# Altium footprint library CONECTER.PcbLib: 120 footprints (part 6 of 8)
Each footprint in its own frame and in the unit in brackets; x right, y up, seen from the top. Pads: shape width x height; smd on the part's side, far side on the other; paste and mask are expansions set on the pad; w line width, h text height; cw(c..) or ccw(c..) is an arc to the next point about the centre after c.
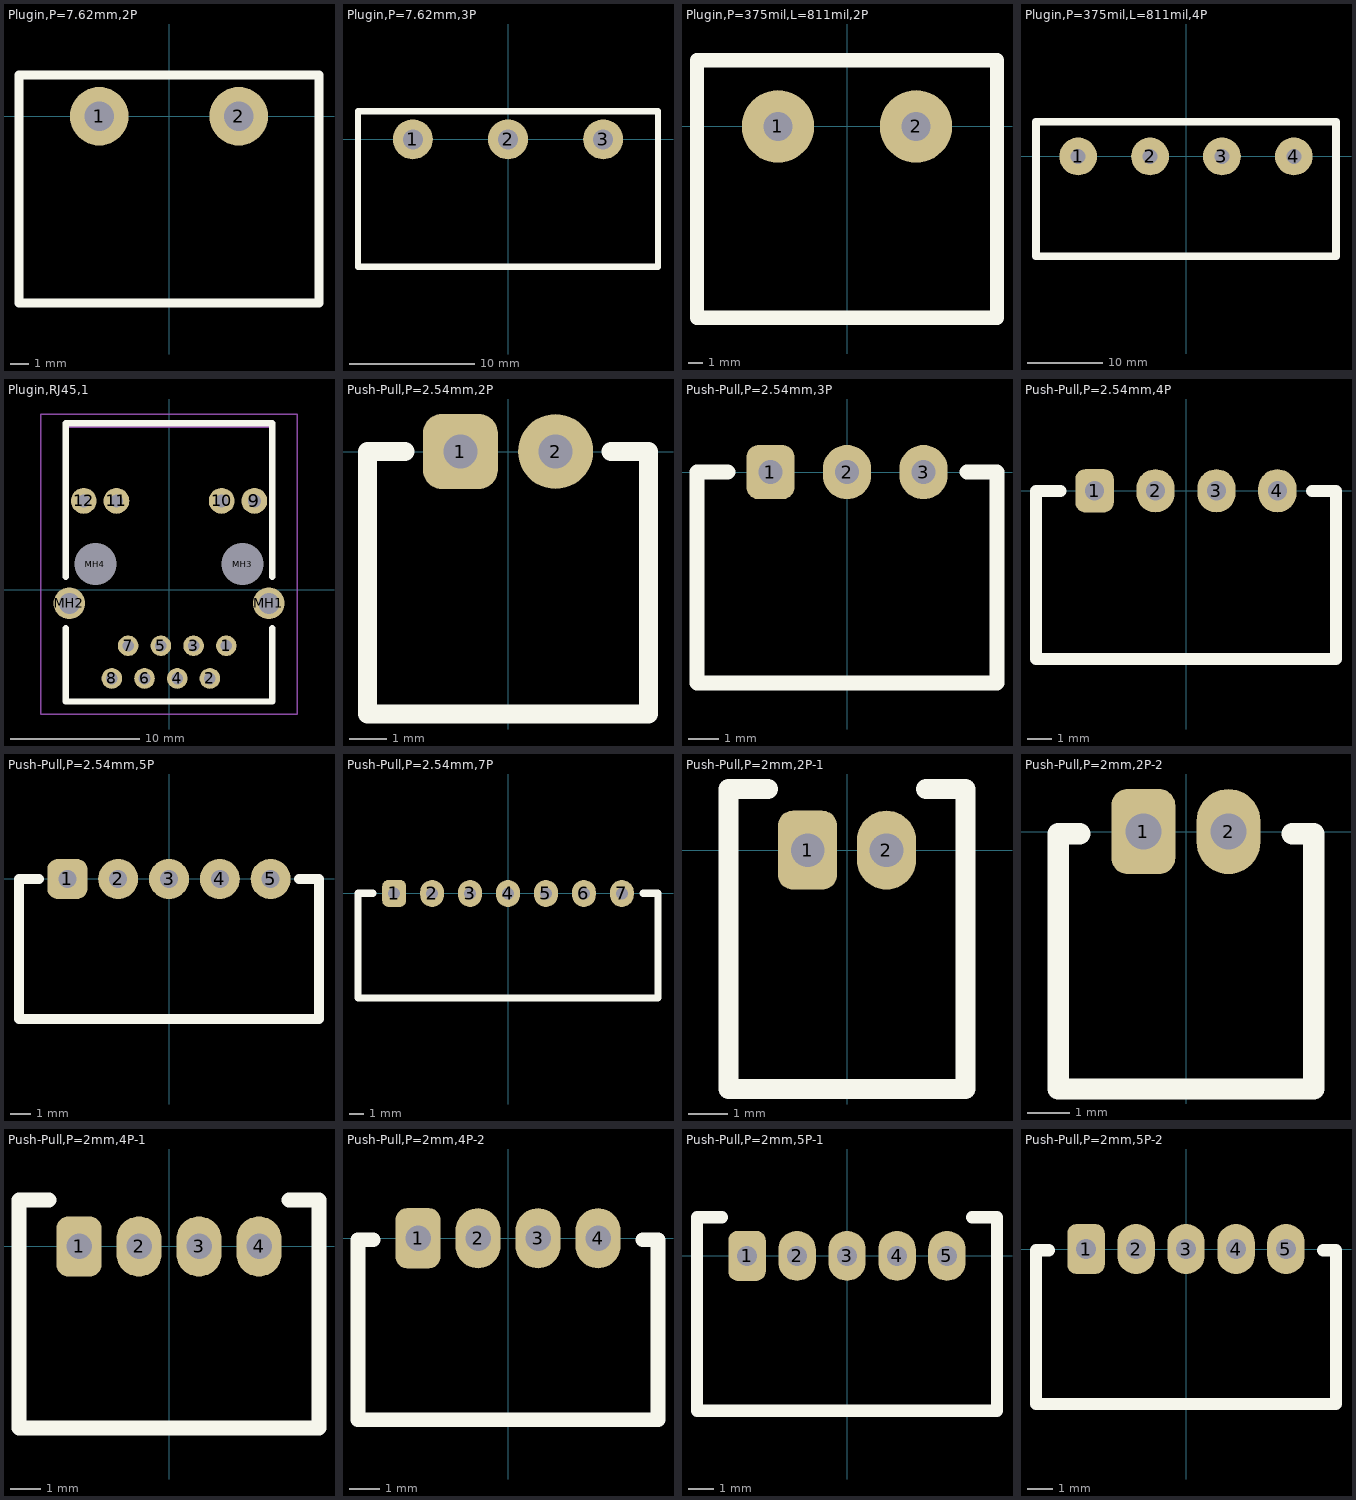
[diagram p5: the footprints below, top view; thin cyan lines are the x and y axes]

## Plugin,P=7.62mm,2P [mm]
pads (2):
  round 3.2 hole 1.6: 1(-3.81,0) 2(3.81,0)
Top Overlay:
  lines w0.5: -8.195,-10.2 8.195,-10.2 8.195,2.25 -8.195,2.25 -8.195,-10.2

## Plugin,P=7.62mm,3P [mm]
pads (3):
  round 3.2 hole 1.6: 1(-7.62,0) 2(0,0) 3(7.62,0)
Top Overlay:
  lines w0.5: -12.005,-10.2 12.005,-10.2 12.005,2.25 -12.005,2.25 -12.005,-10.2

## Plugin,P=375mil,L=811mil,2P [mm]
pads (2):
  round 5 hole 2 mask+2: 1(-4.763,0) 2(4.763,0)
Top Overlay:
  lines w1: -10.351,-13.208 10.351,-13.208 10.351,4.572 -10.351,4.572 -10.351,-13.208
3D body "c-4-1437652-6-b-3d.stp": height 15.86, standoff -5.09, extent -10.3,-13.208 10.3,4.572

## Plugin,P=375mil,L=811mil,4P [mm]
pads (4):
  round 5 hole 2 mask+2: 1(-14.287,0) 2(-4.763,0) 3(4.763,0) 4(14.287,0)
Top Overlay:
  lines w1: -19.875,-13.208 -19.875,4.572 19.875,4.572 19.875,-13.208 -19.875,-13.208
3D body "c-6-1437652-7-p-3d.stp": height 15.88, standoff -5.08, extent -19.825,-13.208 19.825,4.572

## Plugin,RJ45,1 [mm]
pads (16):
  round 1.6 hole 0.9: 1(4.445,-4.355) 2(3.175,-6.895) 3(1.905,-4.355) 4(0.635,-6.895) 5(-0.635,-4.355) 6(-1.905,-6.895) 7(-3.175,-4.355) 8(-4.445,-6.895)
  round 2 hole 1: 9(6.625,6.895) 10(4.085,6.895) 11(-4.085,6.895) 12(-6.625,6.895)
  round 2.445 hole 1.63: MH1(7.745,-1.055) MH2(-7.745,-1.055)
  round 1.625 hole 3.25 unplated: MH3(5.715,1.995) MH4(-5.715,1.995)
Top Overlay:
  lines w0.1: -8.02,-8.655 -8.02,-3.255 ; 8.02,-8.655 8.02,-3.255 ; 8.02,1.245 8.02,12.915
  lines w0.5: -8.02,-3 -8.02,-8.685 8.02,-8.685 8.02,-3 ; -8.02,0.995 -8.02,12.915 ; -8.02,1 -8.02,12.915 ; 8.02,1 8.02,12.915 -8.02,12.915
Mechanical 15:
  lines w0.2: -8.02,-8.655 8.02,-8.655 ; -8.02,12.645 8.02,12.645
Mechanical 20:
  lines w0.1: -9.972,-9.655 9.963,-9.655 9.963,13.645 -9.972,13.645 -9.972,-9.655
3D body "HR911105A.stp": height 13.97, standoff -2.53, extent -8.006,-8.578 7.874,12.822

## Push-Pull,P=2.54mm,2P [mm]
pads (2):
  rrect50% 2x2 hole 0.9 mask+0.1: 1(-1.27,0)
  round 2 hole 0.9 mask+0.1: 2(1.27,0)
Top Overlay:
  lines w0.5: -2.75,0 -3.75,0 -3.75,-7 3.75,-7 3.75,0 2.75,0
3D body "JST - XH - Thru (R) - 2Pin - 2.54mm.stp": height 5.84, standoff -3.38, extent -3.607,-7.534 3.607,0.503

## Push-Pull,P=2.54mm,3P [mm]
pads (3):
  rrect50% 1.6x1.8 hole 0.8 mask+0.1: 1(-2.54,0)
  oval 1.6x1.8 hole 0.8 mask+0.1: 2(0,0) 3(2.54,0)
Top Overlay:
  lines w0.5: -4.98,0 -4.98,-7 4.98,-7 4.98,0 3.98,0 ; -4.96,0 -3.96,0
3D body "JST - XH - Thru R - 3Pin - 2.54mm.stp": height 5.84, standoff -3.38, extent -4.877,-7.534 4.877,0.503

## Push-Pull,P=2.54mm,4P [mm]
pads (4):
  rrect50% 1.6x1.8 hole 0.8 mask+0.1: 1(-3.81,0)
  oval 1.6x1.8 hole 0.8 mask+0.1: 2(-1.27,0) 3(1.27,0) 4(3.81,0)
Top Overlay:
  lines w0.5: -6.25,0 -6.25,-7 6.25,-7 6.25,0 5.25,0 ; -6.23,0 -5.23,0
3D body "JST - XH - Thru R - 4Pin - 2.54mm.stp": height 5.84, standoff -3.38, extent -6.147,-7.534 6.147,0.503

## Push-Pull,P=2.54mm,5P [mm]
pads (5):
  rrect50% 2x2 hole 0.9 mask+0.1: 1(-5.08,0)
  round 2 hole 0.9 mask+0.1: 2(-2.54,0) 3(0,0) 4(2.54,0) 5(5.08,0)
Top Overlay:
  lines w0.5: -6.5,0 -7.5,0 -7.5,-7 7.5,-7 7.5,0 6.5,0
3D body "JST - XH - Thru R - 5Pin - 2.54mm.stp": height 5.84, standoff -3.38, extent -7.417,-7.534 7.417,0.503

## Push-Pull,P=2.54mm,7P [mm]
pads (7):
  rrect50% 1.6x1.8 hole 0.8 mask+0.1: 1(-7.62,0)
  oval 1.6x1.8 hole 0.8 mask+0.1: 2(-5.08,0) 3(-2.54,0) 4(0,0) 5(2.54,0) 6(5.08,0) 7(7.62,0)
Top Overlay:
  lines w0.5: -9.04,0 -10.04,0 -10.04,-7 10.04,-7 10.04,0 9.04,0
3D body "JST - XH - Thru (R) - 7Pin - 2.54mm.stp": height 5.84, standoff -3.38, extent -9.957,-7.034 9.957,1.003

## Push-Pull,P=2mm,2P-1 [mm]
pads (2):
  rrect50% 1.5x2 hole 0.85: 1(-1,0)
  oval 1.5x2 hole 0.85: 2(1,0)
Top Overlay:
  lines w0.5: -2,1.55 -3,1.55 -3,-6.05 3,-6.05 3,1.55 2,1.55
3D body "JST-S2B-PH-K-S.STEP": height 4.8, standoff -3.4, extent -2.95,-6.1 2.95,1.5

## Push-Pull,P=2mm,2P-2 [mm]
pads (2):
  rrect50% 1.5x2 hole 0.85: 1(-1,0)
  oval 1.5x2 hole 0.85: 2(1,0)
Top Overlay:
  lines w0.5: -2.5,-0.05 -3,-0.05 -3,-6.05 3,-6.05 3,-0.05 2.5,-0.05
3D body "JST-S2B-PH-K-S.STEP": height 4.8, standoff -3.4, extent -2.95,-6.1 2.95,1.5

## Push-Pull,P=2mm,4P-1 [mm]
pads (4):
  rrect50% 1.5x2 hole 0.85: 1(-3,0)
  oval 1.5x2 hole 0.85: 2(-1,0) 3(1,0) 4(3,0)
Top Overlay:
  lines w0.5: -4,1.55 -5,1.55 -5,-6.05 5,-6.05 5,1.55 4,1.55
3D body "JST-S4B-PH-K-S.STEP": height 4.8, standoff -3.4, extent -4.95,-6.05 4.95,1.55

## Push-Pull,P=2mm,4P-2 [mm]
pads (4):
  rrect50% 1.5x2 hole 0.85 mask+0.102: 1(-3,0)
  oval 1.5x2 hole 0.85 mask+0.102: 2(-1,0) 3(1,0) 4(3,0)
Top Overlay:
  lines w0.5: -4.5,-0.05 -5,-0.05 -5,-6.05 5,-6.05 5,-0.05 4.5,-0.05
3D body "JST-S4B-PH-K-S.STEP": height 4.8, standoff -3.4, extent -4.95,-6.05 4.95,1.55

## Push-Pull,P=2mm,5P-1 [mm]
pads (5):
  rrect50% 1.5x2 hole 0.8 mask+0.15: 1(-4,0)
  oval 1.5x2 hole 0.8 mask+0.15: 2(-2,0) 3(0,0) 4(2,0) 5(4,0)
Top Overlay:
  lines w0.5: -6,1.4 -6,-6.2 6,-6.2 6,1.4 ; -6,1.55 -5,1.55 ; 5,1.55 6,1.55
3D body "JST-S5B-PH-K-S.STEP": height 4.8, standoff -3.4, extent -5.95,-6 5.95,1.6

## Push-Pull,P=2mm,5P-2 [mm]
pads (5):
  rrect50% 1.5x2 hole 0.8 mask+0.15: 1(-4,0)
  oval 1.5x2 hole 0.8 mask+0.15: 2(-2,0) 3(0,0) 4(2,0) 5(4,0)
Top Overlay:
  lines w0.5: -5.5,-0.05 -6,-0.05 -6,-6.2 6,-6.2 6,-0.05 5.5,-0.05
3D body "JST-S5B-PH-K-S.STEP": height 4.8, standoff -3.4, extent -5.95,-6 5.95,1.6